# Altium footprint library lib_protel_HC.PCBLIB: 724 footprints (part 39 of 46)
Each footprint in its own frame and in the unit in brackets; x right, y up, seen from the top. Pads: shape width x height; smd on the part's side, far side on the other; paste and mask are expansions set on the pad; w line width, h text height; cw(c..) or ccw(c..) is an arc to the next point about the centre after c.
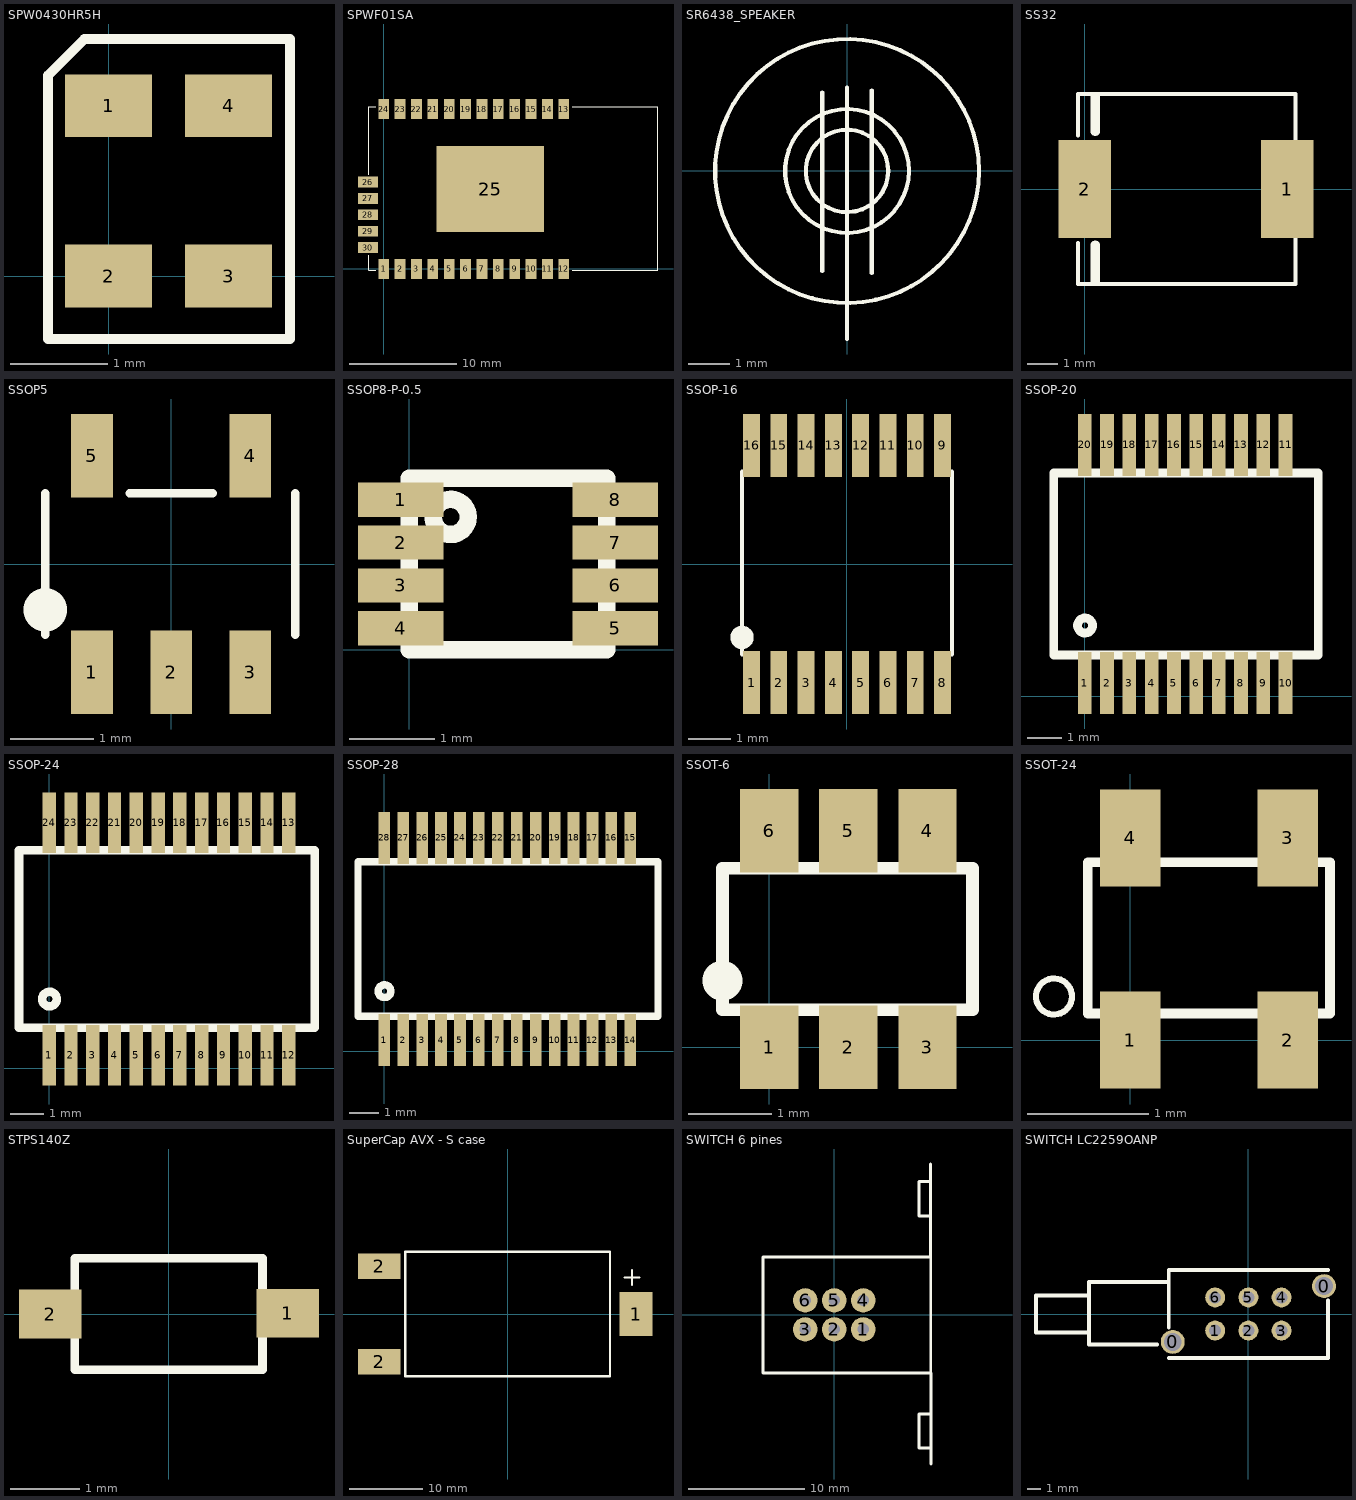
[diagram p38: the footprints below, top view; thin cyan lines are the x and y axes]

## SPW0430HR5H [mm] "MICROPHONE"
height 1.1
pads (4):
  rect 0.9x0.65 smd: 1(0,1.76) 2(0,0) 3(1.24,0) 4(1.24,1.76)
Top Overlay:
  lines w0.1: -0.625,-0.65 -0.625,2.075 -0.25,2.45 1.875,2.45 1.875,-0.65 -0.625,-0.65

## SPWF01SA [mm] "WIFI MODULE ST"
height 2.35
pads (30):
  rect 1x1.85 smd: 1(0,0) 2(1.524,0) 3(3.048,0) 4(4.572,0) 5(6.096,0) 6(7.62,0) 7(9.144,0) 8(10.668,0) 9(12.192,0) 10(13.716,0) 11(15.24,0) 12(16.764,0) 13(16.764,14.87) 14(15.24,14.87) 15(13.716,14.87) 16(12.192,14.87) 17(10.668,14.87) 18(9.144,14.87) 19(7.62,14.87) 20(6.096,14.87) 21(4.572,14.87) 22(3.048,14.87) 23(1.524,14.87) 24(0,14.87)
  rect 10x8 smd: 25(9.9,7.435)
  rect 1.85x1 smd: 26(-1.47,8.076) 27(-1.47,6.552) 28(-1.47,5.028) 29(-1.47,3.504) 30(-1.47,1.98)
Top Overlay:
  lines w0.1: -1.397,1.27 -1.397,-0.127 -0.762,-0.127 ; -1.397,8.763 -1.397,15.113 -0.762,15.113 ; 17.526,-0.127 25.527,-0.127 25.527,15.113 17.526,15.113

## SR6438_SPEAKER [mm] "SPEAKER"
height 4
Top Overlay:
  circle w0.1: c0,0 r1.502
  circle w0.1: c0,0 r1
  circle w0.1: c0,0 r3.2
  lines w0.1: -0.6,-2.425 -0.6,1.9 ; 0,-4.075 0,2.025 ; 0.6,-2.475 0.6,1.95

## SS32 [mm] "DIODO SCHOTTKY"
height 2.62
pads (2):
  rect 1.72x3.2 smd mask+0.102: 1(6.61,0) 2(0,0)
Top Overlay:
  lines w0.127: -0.23,-1.77 -0.23,-3.11 6.88,-3.11 6.88,3.11 -0.23,3.11 ; -0.23,1.75 -0.23,3.1
  lines w0.3: 0.34,-3.01 0.34,-1.83 ; 0.34,1.88 0.34,3.02

## SSOP5 [mm] "SSOP5"
height 1.25
pads (5):
  rect 0.5x1 smd: 1(-0.95,-1.3) 2(0,-1.3) 3(0.95,-1.3) 4(0.95,1.3) 5(-0.95,1.3)
Top Overlay:
  circle w0.457: c-1.51,-0.55 r0.031
  lines w0.1: -1.51,-0.85 -1.51,0.85 ; -0.5,0.85 0.5,0.85 ; 1.49,-0.85 1.49,0.85

## SSOP8-P-0.5 [mm]
height 0.7
pads (8):
  rect 1x0.4 smd: 1(-0.1,1.75) 2(-0.1,1.25) 3(-0.1,0.75) 4(-0.1,0.25) 5(2.4,0.25) 6(2.4,0.75) 7(2.4,1.25) 8(2.4,1.75)
Top Overlay:
  circle w0.203: c0.481,1.549 r0.205
  lines w0.203: 0,0 2.3,0 2.3,2 0,2 0,0

## SSOP-16 [mm]
height 2
pads (16):
  rect 0.4x1.5 smd: 1(-2.275,-2.825) 2(-1.625,-2.825) 3(-0.975,-2.825) 4(-0.325,-2.825) 5(0.325,-2.825) 6(0.975,-2.825) 7(1.625,-2.825) 8(2.275,-2.825) 9(2.275,2.825) 10(1.625,2.825) 11(0.975,2.825) 12(0.325,2.825) 13(-0.325,2.825) 14(-0.975,2.825) 15(-1.625,2.825) 16(-2.275,2.825)
Top Overlay:
  circle w0.254: c-2.5,-1.75 r0.15
  lines w0.1: -2.5,-2.15 -2.5,2.2 ; 2.5,-2.15 2.5,2.2

## SSOP-20 [mm] "PIC18F14K50"
height 2
pads (20):
  rect 0.4x1.8 smd: 1(0,0.381) 2(0.65,0.381) 3(1.3,0.381) 4(1.95,0.381) 5(2.6,0.381) 6(3.25,0.381) 7(3.9,0.381) 8(4.55,0.381) 9(5.2,0.381) 10(5.85,0.381) 11(5.85,7.317) 12(5.2,7.317) 13(4.55,7.317) 14(3.9,7.317) 15(3.25,7.317) 16(2.6,7.317) 17(1.95,7.317) 18(1.3,7.317) 19(0.65,7.317) 20(0,7.317)
Top Overlay:
  circle w0.254: c0.01,2.057 r0.218
  lines w0.254: -0.9,1.2 -0.9,6.5 6.8,6.5 6.8,1.2 -0.9,1.2
3D body "SW3dPS-SSOP_20.STEP": height 1.79, standoff -0.05, extent -0.75,-0.1 6.55,7.8

## SSOP-24 [mm] "LTC4100"
height 2
pads (24):
  rect 0.4x1.8 smd: 1(0,0.381) 2(0.65,0.381) 3(1.3,0.381) 4(1.95,0.381) 5(2.6,0.381) 6(3.25,0.381) 7(3.9,0.381) 8(4.55,0.381) 9(5.2,0.381) 10(5.85,0.381) 11(6.5,0.381) 12(7.15,0.381) 13(7.15,7.317) 14(6.5,7.317) 15(5.85,7.317) 16(5.2,7.317) 17(4.55,7.317) 18(3.9,7.317) 19(3.25,7.317) 20(2.6,7.317) 21(1.95,7.317) 22(1.3,7.317) 23(0.65,7.317) 24(0,7.317)
Top Overlay:
  circle w0.254: c0.01,2.057 r0.218
  lines w0.254: -0.9,1.2 -0.9,6.5 7.925,6.5 7.925,1.2 -0.9,1.2

## SSOP-28 [mm] "PIC16F876"
height 1.8
pads (28):
  rect 0.4x1.8 smd: 1(0,0.381) 2(0.65,0.381) 3(1.3,0.381) 4(1.95,0.381) 5(2.6,0.381) 6(3.25,0.381) 7(3.9,0.381) 8(4.55,0.381) 9(5.2,0.381) 10(5.85,0.381) 11(6.5,0.381) 12(7.15,0.381) 13(7.8,0.381) 14(8.45,0.381) 15(8.45,7.317) 16(7.8,7.317) 17(7.15,7.317) 18(6.5,7.317) 19(5.85,7.317) 20(5.2,7.317) 21(4.55,7.317) 22(3.9,7.317) 23(3.25,7.317) 24(2.6,7.317) 25(1.95,7.317) 26(1.3,7.317) 27(0.65,7.317) 28(0,7.317)
Top Overlay:
  circle w0.254: c0.01,2.057 r0.218
  lines w0.254: -0.9,1.2 9.4,1.2 9.4,6.5 -0.9,6.5 -0.9,1.2

## SSOT-6 [mm] "SSOT-6"
height 1.1
pads (6):
  rect 0.7x1 smd: 1(0,0) 2(0.95,0) 3(1.9,0) 4(1.9,2.6) 5(0.95,2.6) 6(0,2.6)
Top Overlay:
  circle w0.457: c-0.56,0.8 r0.01
  lines w0.152: -0.56,0.45 -0.56,2.15 2.44,2.15 2.44,0.45 -0.56,0.45

## SSOT-24 [mm] "SSOT-24"
height 1.1
pads (4):
  rect 0.5x0.8 smd: 1(0,0) 2(1.3,0) 3(1.3,1.67) 4(0,1.67)
Top Overlay:
  circle w0.051: c-0.63,0.36 r0.149
  lines w0.08: -0.35,0.22 1.65,0.22 1.65,1.47 -0.35,1.47 -0.35,0.22

## STPS140Z [mm]
pads (2):
  rect 0.9x0.7 smd: 1(1.71,0.01) 2(-1.7,0)
Top Overlay:
  lines w0.127: -1.35,-0.8 -1.35,0 -1.35,0.8 1.35,0.8 1.35,-0.8 -1.35,-0.8

## SuperCap AVX - S case [mm] "Supercapacitor High power pulse"
height 3.2
pads (3):
  rect 4.5x6 smd: 1(17.55,0)
  rect 5.8x3.5 smd: 2(-17.55,-6.5) 2(-17.55,6.5)
Top Overlay:
  lines w0.3: 16,5 18,5 ; 17,4 17,6 ; -14,-8.5 14,-8.5 14,8.5 -14,8.5 -14,-8.5

## SWITCH 6 pines [mm] "Pulsador"
height 9.1
pads (6):
  round 2.1 hole 1: 1(2.5,-1.25) 2(0,-1.25) 3(-2.5,-1.25) 4(2.5,1.25) 5(0,1.25) 6(-2.5,1.25)
Top Overlay:
  lines w0.254: -6.136,-5.004 8.317,-5.004 8.317,4.978 -6.136,4.978 ; 8.306,4.928 8.306,13.005 ; 8.308,8.534 7.29,8.534 7.29,11.489 8.308,11.489 ; 8.331,-12.852 8.331,-5.004 ; 8.333,-11.481 7.315,-11.481 7.315,-8.526 8.333,-8.526
  lines w0.255: -6.136,-5.004 -6.136,4.953

## SWITCH LC2259OANP [mm]
height 8.3
pads (8):
  round 1.8 hole 1.35: 0(-5.7,-2.1) 0(5.7,2.1)
  round 1.5 hole 0.9: 1(-2.5,-1.25) 2(0,-1.25) 3(2.5,-1.25) 4(2.5,1.25) 5(0,1.25) 6(-2.5,1.25)
Top Overlay:
  lines w0.3: -12,-1.4 -16,-1.4 -16,1.4 -12,1.4 ; -6.9,-2.3 -12,-2.3 -12,2.4 -6,2.4 ; -6,-3.3 6,-3.3 6,1 ; -6,-1 -6,3.3 6,3.3